# Altium footprint library Connectors Pad Lib.PcbLib: 211 footprints (part 9 of 14)
Each footprint in its own frame and in the unit in brackets; x right, y up, seen from the top. Pads: shape width x height; smd on the part's side, far side on the other; paste and mask are expansions set on the pad; w line width, h text height; cw(c..) or ccw(c..) is an arc to the next point about the centre after c.
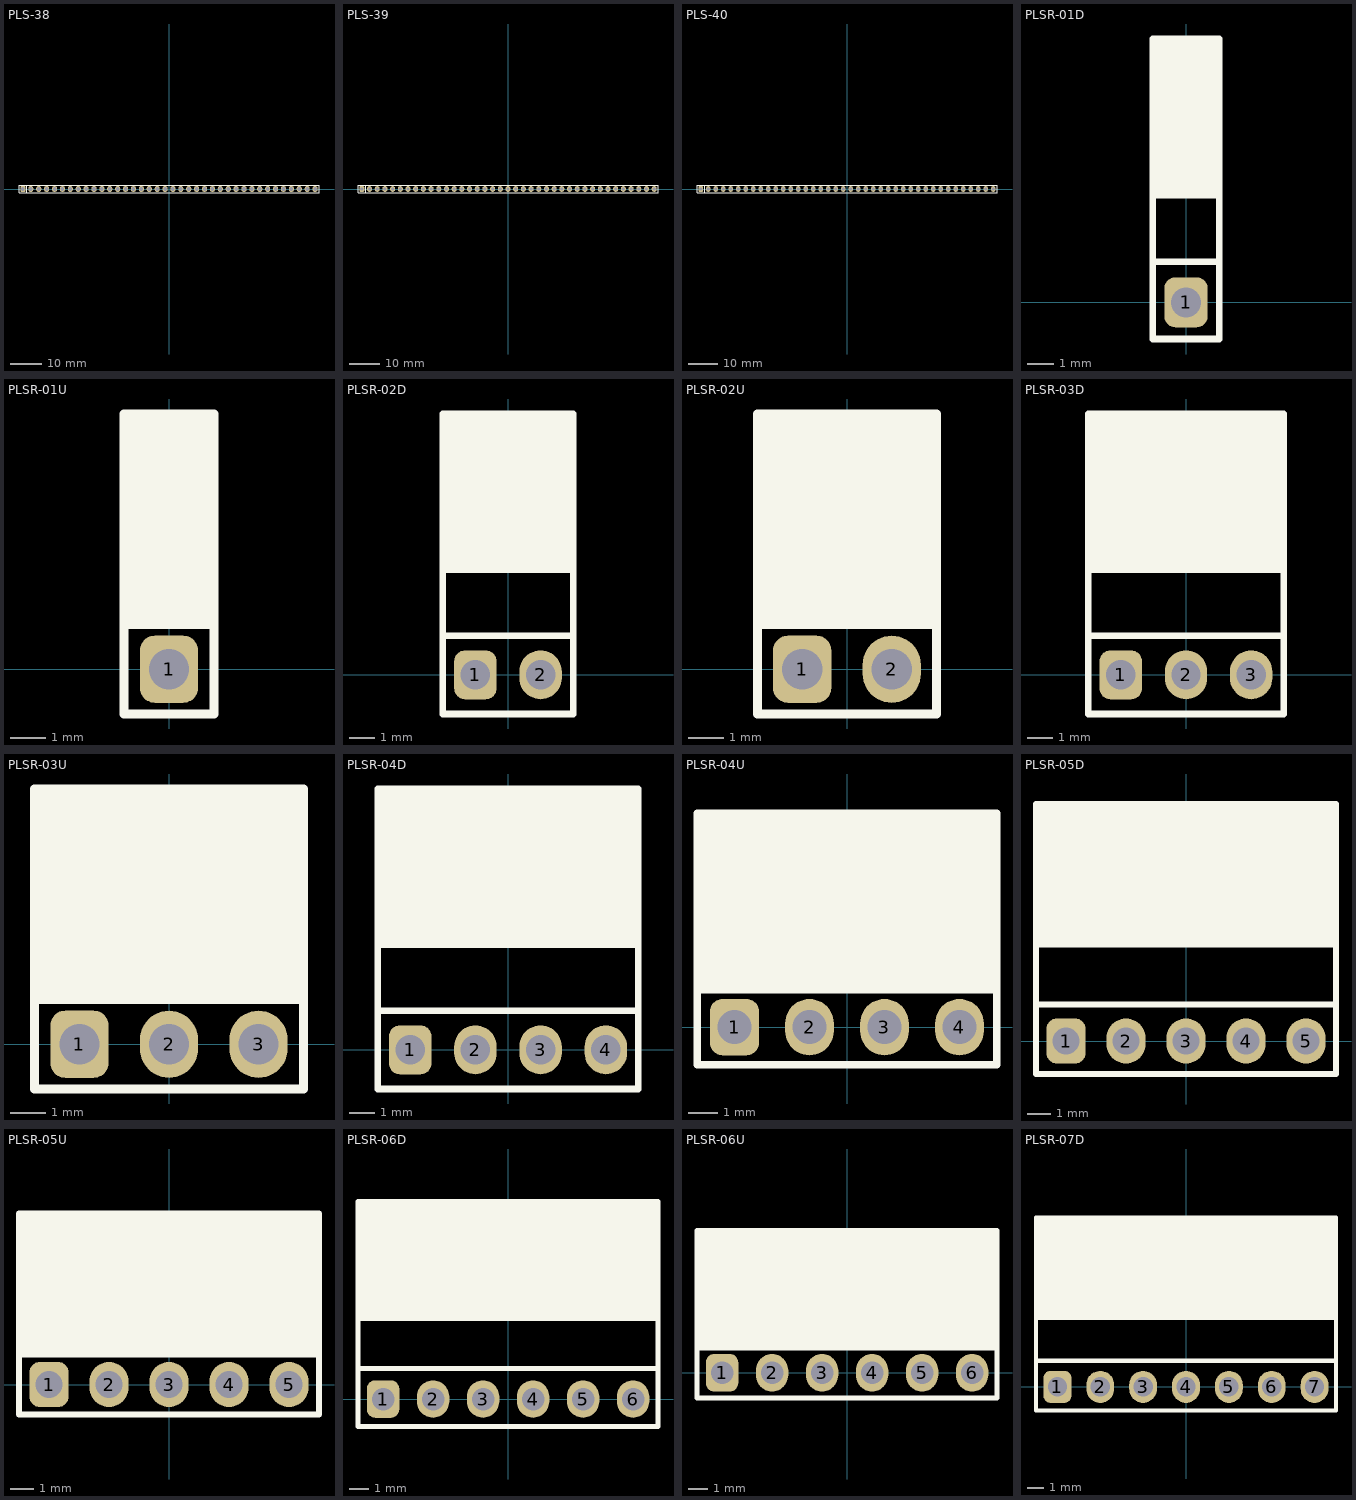
[diagram p8: the footprints below, top view; thin cyan lines are the x and y axes]

## PLS-38 [mil] "PCB Vertical Single Connector 38-Pin"
height 336.22
pads (38):
  rrect50% 65x75 hole 45: 1(-1850,0)
  oval 65x75 hole 45: 2(-1750,0) 3(-1650,0) 4(-1550,0) 5(-1450,0) 6(-1350,0) 7(-1250,0) 8(-1150,0) 9(-1050,0) 10(-950,0) 11(-850,0) 12(-750,0) 13(-650,0) 14(-550,0) 15(-450,0) 16(-350,0) 17(-250,0) 18(-150,0) 19(-50,0) 20(50,0) 21(150,0) 22(250,0) 23(350,0) 24(450,0) 25(550,0) 26(650,0) 27(750,0) 28(850,0) 29(950,0) 30(1050,0) 31(1150,0) 32(1250,0) 33(1350,0) 34(1450,0) 35(1550,0) 36(1650,0) 37(1750,0) 38(1850,0)
Top Overlay:
  lines w10: -1800,-50 -1800,50 ; -1900,-50 1900,-50 1900,50 -1900,50 -1900,-50
3D body "PLS-38.STEP": height 341.16, standoff -117.11, extent -1900,-50 1900,50

## PLS-39 [mil] "PCB Vertical Single Connector 39-Pin"
height 336.22
pads (39):
  rrect50% 65x75 hole 45: 1(-1900,0)
  oval 65x75 hole 45: 2(-1800,0) 3(-1700,0) 4(-1600,0) 5(-1500,0) 6(-1400,0) 7(-1300,0) 8(-1200,0) 9(-1100,0) 10(-1000,0) 11(-900,0) 12(-800,0) 13(-700,0) 14(-600,0) 15(-500,0) 16(-400,0) 17(-300,0) 18(-200,0) 19(-100,0) 20(0,0) 21(100,0) 22(200,0) 23(300,0) 24(400,0) 25(500,0) 26(600,0) 27(700,0) 28(800,0) 29(900,0) 30(1000,0) 31(1100,0) 32(1200,0) 33(1300,0) 34(1400,0) 35(1500,0) 36(1600,0) 37(1700,0) 38(1800,0) 39(1900,0)
Top Overlay:
  lines w10: -1850,-50 -1850,50 ; -1950,-50 1950,-50 1950,50 -1950,50 -1950,-50
3D body "PLS-39.STEP": height 341.16, standoff -117.11, extent -1950,-50 1950,50

## PLS-40 [mil] "PCB Vertical Single Connector 40-Pin"
height 336.22
pads (40):
  rrect50% 65x75 hole 45: 1(-1950,0)
  oval 65x75 hole 45: 2(-1850,0) 3(-1750,0) 4(-1650,0) 5(-1550,0) 6(-1450,0) 7(-1350,0) 8(-1250,0) 9(-1150,0) 10(-1050,0) 11(-950,0) 12(-850,0) 13(-750,0) 14(-650,0) 15(-550,0) 16(-450,0) 17(-350,0) 18(-250,0) 19(-150,0) 20(-50,0) 21(50,0) 22(150,0) 23(250,0) 24(350,0) 25(450,0) 26(550,0) 27(650,0) 28(750,0) 29(850,0) 30(950,0) 31(1050,0) 32(1150,0) 33(1250,0) 34(1350,0) 35(1450,0) 36(1550,0) 37(1650,0) 38(1750,0) 39(1850,0) 40(1950,0)
Top Overlay:
  lines w10: -1900,-50 -1900,50 ; -2000,-50 -2000,50 2000,50 2000,-50 -2000,-50
3D body "PLS-40.STEP": height 341.16, standoff -117.11, extent -2000,-50 2000,50

## PLSR-01D [mil] "PCB Right Angled Single Connector (D Type) 1-Pin"
height 98.43
pads (1):
  rrect50% 65x75 hole 45: 1(0,0)
Top Overlay:
  rectangle: -50,161 50,395
  lines w10: -50,61 50,61 ; -50,161 50,161 ; -50,-55 -50,395 50,395 50,-55 -50,-55
3D body "PLSR-01D.STEP": height 101, standoff -117.11, extent -50,-11.03 50,396.85

## PLSR-01U [mil] "PCB Right Angled Single Connector (U Type) 1-Pin"
height 236.3
pads (1):
  rrect50% 65x75 hole 45: 1(0,0)
Top Overlay:
  rectangle: -50,50 50,285
  lines w10: -50,50 50,50 ; -50,-50 -50,285 50,285 50,-50 -50,-50
3D body "PLSRU-01.STEP": height 239.98, standoff -117.11, extent -50,-50 50,286.22

## PLSR-02D [mil] "PCB Right Angled Single Connector (D Type) 2-Pin"
height 98.42
pads (2):
  rrect50% 65x75 hole 45: 1(-50,0)
  oval 65x75 hole 45: 2(50,0)
Top Overlay:
  rectangle: -100,161 100,395
  lines w10: -100,60 100,60 ; -100,161 100,161 ; -100,-60 100,-60 100,400 -100,400 -100,-60
3D body "PLSR-02D.STEP": height 101, standoff -117.11, extent -100,-11.02 100,396.85

## PLSR-02U [mil] "PCB Right Angled Single Connector (U Type) 2-Pin"
height 236.3
pads (2):
  rrect50% 65x75 hole 45: 1(-50,0)
  oval 65x75 hole 45: 2(50,0)
Top Overlay:
  rectangle: -100,50 100,285
  lines w10: -100,50 100,50 ; -100,-50 100,-50 100,285 -100,285 -100,-50
3D body "PLSRU-02.STEP": height 239.98, standoff -117.11, extent -100,-50 100,286.22

## PLSR-03D [mil] "PCB Right Angled Single Connector (D Type) 3-Pin"
height 98.42
pads (3):
  rrect50% 65x75 hole 45: 1(-100,0)
  oval 65x75 hole 45: 2(0,0) 3(100,0)
Top Overlay:
  rectangle: -150,161 150,395
  lines w10: -150,60 150,60 ; -150,161 150,161 ; -150,-60 -150,400 150,400 150,-60 -150,-60
3D body "PLSR-03D.STEP": height 101, standoff -117.11, extent -150,-11.02 150,396.85

## PLSR-03U [mil] "PCB Right Angled Single Connector (U Type) 3-Pin"
height 236.3
pads (3):
  rrect50% 65x75 hole 45: 1(-100,0)
  oval 65x75 hole 45: 2(0,0) 3(100,0)
Top Overlay:
  rectangle: -150,50 150,285
  lines w10: -150,50 150,50 ; -150,-50 -150,285 150,285 150,-50 -150,-50
3D body "PLSRU-03.STEP": height 239.98, standoff -117.11, extent -150,-50 150,286.22

## PLSR-04D [mil] "PCB Right Angled Single Connector (D Type) 4-Pin"
height 98.42
pads (4):
  rrect50% 65x75 hole 45: 1(-150,0)
  oval 65x75 hole 45: 2(-50,0) 3(50,0) 4(150,0)
Top Overlay:
  rectangle: -200,161 200,395
  lines w10: -200,60 200,60 ; -200,161 200,161 ; -200,-60 200,-60 200,400 -200,400 -200,-60
3D body "PLSR-04D.STEP": height 101, standoff -117.11, extent -200,-11.02 200,396.85

## PLSR-04U [mil] "PCB Right Angled Single Connector (U Type) 4-Pin"
height 236.3
pads (4):
  rrect50% 65x75 hole 45: 1(-150,0)
  oval 65x75 hole 45: 2(-50,0) 3(50,0) 4(150,0)
Top Overlay:
  rectangle: -200,50 200,285
  lines w10: -200,50 200,50 ; -200,-50 -200,285 200,285 200,-50 -200,-50
3D body "PLSRU-04.STEP": height 239.98, standoff -117.11, extent -200,-50 200,286.22

## PLSR-05D [mil] "PCB Right Angled Single Connector (D Type) 5-Pin"
height 98.42
pads (5):
  rrect50% 65x75 hole 45: 1(-200,0)
  oval 65x75 hole 45: 2(-100,0) 3(0,0) 4(100,0) 5(200,0)
Top Overlay:
  rectangle: -250,161 250,395
  lines w10: -250,61 250,61 ; -250,161 250,161 ; -250,-55 250,-55 250,395 -250,395 -250,-55
3D body "PLSR-05D.STEP": height 101, standoff -117.11, extent -250,-11.02 250,396.85

## PLSR-05U [mil] "PCB Right Angled Single Connector (U Type) 5-Pin"
height 236.3
pads (5):
  rrect50% 65x75 hole 45: 1(-200,0)
  oval 65x75 hole 45: 2(-100,0) 3(0,0) 4(100,0) 5(200,0)
Top Overlay:
  rectangle: -250,50 250,285
  lines w10: -250,50 250,50 ; -250,-50 -250,285 250,285 250,-50 -250,-50
3D body "PLSRU-05.STEP": height 239.98, standoff -117.11, extent -250,-50 250,286.22

## PLSR-06D [mil] "PCB Right Angled Single Connector (D Type) 6-Pin"
height 98.42
pads (6):
  rrect50% 65x75 hole 45: 1(-250,0)
  oval 65x75 hole 45: 2(-150,0) 3(-50,0) 4(50,0) 5(150,0) 6(250,0)
Top Overlay:
  rectangle: -300,161 300,395
  lines w10: -300,61 300,61 ; -300,161 300,161 ; -300,-55 300,-55 300,395 -300,395 -300,-55
3D body "PLSR-06D.STEP": height 101, standoff -117.11, extent -300,-11.02 300,396.85

## PLSR-06U [mil] "PCB Right Angled Single Connector (U Type) 6-Pin"
height 236.3
pads (6):
  rrect50% 65x75 hole 45: 1(-250,0)
  oval 65x75 hole 45: 2(-150,0) 3(-50,0) 4(50,0) 5(150,0) 6(250,0)
Top Overlay:
  rectangle: -300,50 300,285
  lines w10: -300,50 300,50 ; -300,-50 -300,285 300,285 300,-50 -300,-50
3D body "PLSRU-06.STEP": height 239.98, standoff -117.11, extent -300,-50 300,286.22

## PLSR-07D [mil] "PCB Right Angled Single Connector (D Type) 7-Pin"
height 98.42
pads (7):
  rrect50% 65x75 hole 45: 1(-300,0)
  oval 65x75 hole 45: 2(-200,0) 3(-100,0) 4(0,0) 5(100,0) 6(200,0) 7(300,0)
Top Overlay:
  rectangle: -350,161 350,395
  lines w10: -350,61 350,61 ; -350,161 350,161 ; -350,-55 350,-55 350,395 -350,395 -350,-55
3D body "PLSR-07D.STEP": height 101, standoff -117.11, extent -350,-11.02 350,396.85